# Altium footprint library MyPcbLib.PcbLib: 657 footprints (part 36 of 42)
Each footprint in its own frame and in the unit in brackets; x right, y up, seen from the top. Pads: shape width x height; smd on the part's side, far side on the other; paste and mask are expansions set on the pad; w line width, h text height; cw(c..) or ccw(c..) is an arc to the next point about the centre after c.
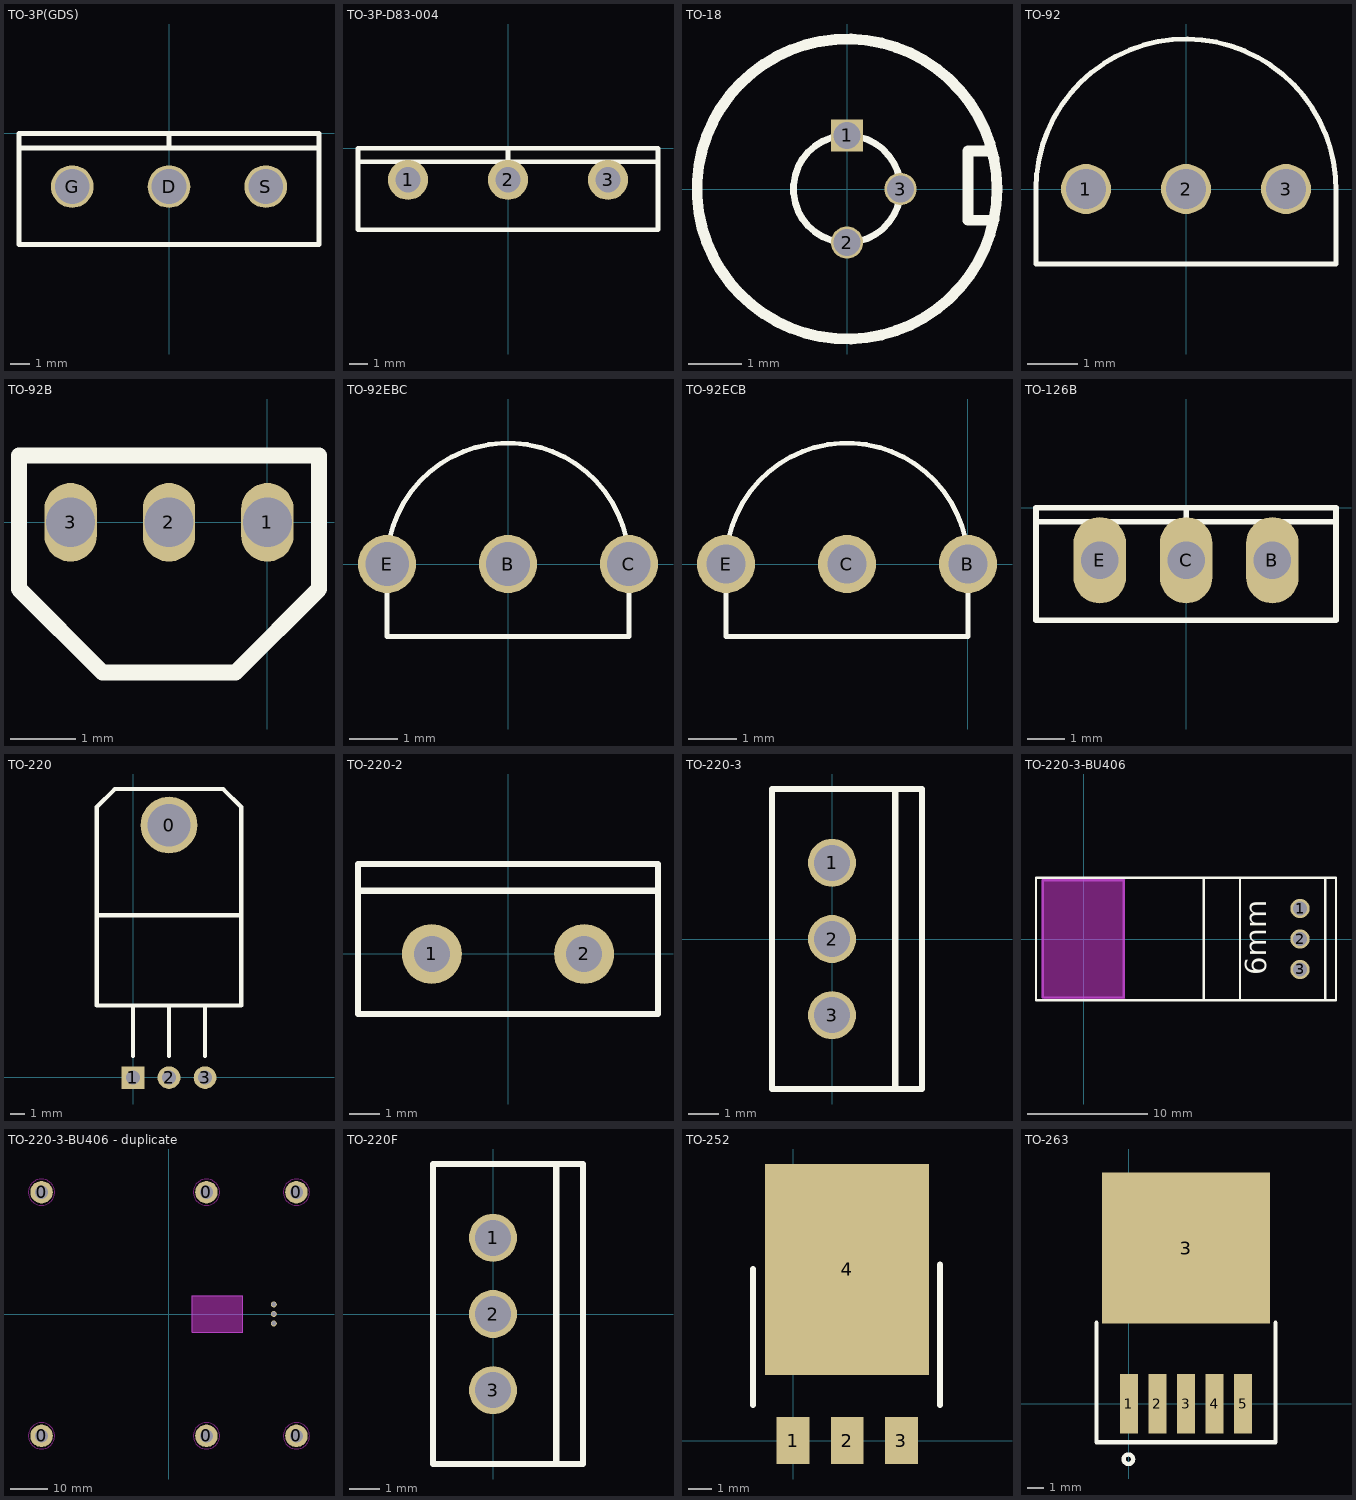
[diagram p35: the footprints below, top view; thin cyan lines are the x and y axes]

## TO-3P(GDS) [mm]
pads (3):
  round 2.2 / inner round 2.2 / far side oval 2.6x4 hole 1.8: D(0,-2.75) G(-5,-2.75) S(5,-2.75)
Top Overlay:
  lines w0.25: -7.75,-0.75 7.75,-0.75 ; 0,-0.75 0,0 ; -7.75,-5.75 7.75,-5.75 7.75,0 -7.75,0 -7.75,-5.75

## TO-3P-D83-004 [mm]
pads (3):
  round 2.2 / inner round 2.2 / far side oval 2.6x4 hole 1.4: 1(-5.5,-1.75) 2(0,-1.75) 3(5.5,-1.75)
Top Overlay:
  lines w0.25: -8.25,-0.75 8.25,-0.75 ; 0,-0.75 0,0 ; -8.25,-4.5 -8.25,0 8.25,0 8.25,-4.5 -8.25,-4.5

## TO-18 [mm]
pads (3):
  rect 0.6x0.6 hole 0.5: 1(0,1)
  round 0.6 hole 0.5: 2(0,-1) 3(1,0)
Top Overlay:
  circle w0.127: c0,0 r1
  circle w0.203: c0,0 r2.8
  lines w0.203: 2.667,-0.584 2.261,-0.584 2.261,0.711 2.667,0.711

## TO-92 [mm]
pads (3):
  round 1 hole 0.8: 1(-2,0) 2(0,0) 3(2,0)
Top Overlay:
  lines w0.1: 3,-0.053 ccw(c0,0) -3,0 -3,-1.5 3,-1.5 3,0

## TO-92B [mm]
pads (3):
  oval 0.8x1.2 hole 0.75: 1(0,0) 2(-1.5,0) 3(-3,0)
Top Overlay:
  lines w0.245: -3.786,-1.016 -2.516,-2.286 -0.484,-2.286 0.786,-1.016 0.786,1.016 -3.786,1.016 -3.786,-1.016
3D body: height 7.58, standoff -2, extent -3.786,-2.416 0.794,1.144

## TO-92EBC [mm]
pads (3):
  round 1.2 / inner round 1.2 / far side oval 1.6x2 hole 0.9: B(0,0) C(2.5,0) E(-2.5,0)
Top Overlay:
  lines w0.1: -2.5,-1.5 2.5,-1.5 2.5,0 ccw(c0,0) -2.5,0 -2.5,-1.5

## TO-92ECB [mm]
pads (3):
  round 1.2 / inner round 1.2 / far side oval 1.4x2 hole 0.8: B(0,0) C(-2.5,0) E(-5,0)
Top Overlay:
  lines w0.1: -5,-1.5 0,-1.5 0,0 ccw(c-2.5,0) -5,0 -5,-1.5

## TO-126B [mm]
pads (3):
  oval 1.4x2.3 hole 1: B(2.3,-1.4) C(0,-1.4) E(-2.3,-1.4)
Top Overlay:
  lines w0.15: -4,-0.382 -4,-0.375 3.995,-0.375 ; 0,-0.375 0,0 ; -4,-3 3.995,-3 3.995,0 -4,0 -4,-3

## TO-220 [mm]
pads (4):
  round 4 hole 3: 0(2.531,17.769)
  rect 1.6x1.6 hole 1: 1(-0.009,-0.011)
  round 1.6 hole 1: 2(2.531,-0.011) 3(5.071,-0.011)
Top Overlay:
  lines w0.305: -2.549,11.419 7.611,11.419 ; -0.009,1.513 -0.009,5.069 ; 2.531,1.513 2.531,5.069 ; 5.071,1.513 5.071,5.069 ; -2.549,5.069 7.611,5.069 7.611,16.499 7.611,19.039 6.341,20.309 -1.279,20.309 -2.549,19.039 -2.549,16.499 -2.549,5.069
3D body: height 4.25, standoff -2, extent -2.469,-0.011 7.531,20.989

## TO-220-2 [mm]
pads (2):
  round 2 hole 1.2: 1(-2.54,0) 2(2.54,0)
Top Overlay:
  lines w0.203: -5,2.108 4.924,2.108 ; -5,-2 -5,3 5,3 5,-2 -5,-2
3D body: height 15.2, standoff -2, extent -4.924,-2.032 5.076,2.368

## TO-220-3 [mm]
pads (3):
  round 1.6 hole 1.2: 1(0,2.54) 2(0,0) 3(0,-2.54)
Top Overlay:
  lines w0.203: 2.108,-4.924 2.108,5 ; -2,-5 -2,5 3,5 3,-5 -2,-5
3D body: height 0, standoff -17.2, extent -2.108,-5.025 2.292,4.975

## TO-220-3-BU406 [mm]
pads (3):
  round 1.6 hole 1.2: 1(18.009,2.54) 2(18.009,0) 3(18.009,-2.54)
Top Overlay:
  lines w0.203: -3.991,-5.1 21.009,-5.1 ; -3.991,-5.029 -3.991,4.978 ; -3.991,5.1 21.009,5.1 ; 10,-4.953 10,4.978 ; 13.009,-4.978 13.009,4.953 ; 20.117,-4.924 20.117,5 ; 21.009,-5 21.009,5
  text "6mm" at 15.773,-3.023 h3
Keep-Out Layer:
  board cut-out: -3.455,-4.877 -3.463,4.851 -3.453,4.876 -3.452,4.876 -3.453,4.876 -3.464,4.902 -3.431,4.98 -3.353,5.013 -3.353,5.004 3.411,5.008 3.433,4.953 3.411,4.898 3.406,4.902 3.411,-4.873 3.433,-4.928 3.411,-4.983 3.406,-4.979 -3.353,-4.987 -3.431,-4.955 -3.463,-4.877
Keep-Out Layer:
  lines w0.203: -3.429,4.851 -3.429,-4.877 3.33,-4.877 3.33,4.902 -3.429,4.902
Mechanical 1:
  lines w0.203: -3.429,4.851 -3.429,-4.877 3.33,-4.877 3.33,4.902 -3.429,4.902
3D body: height 6.7, standoff -2, extent -3.372,-5.044 18.308,5.156

## TO-220-3-BU406 - duplicate [mm]
pads (9):
  round 6 hole 3.5: 0(-34,-32.5) 0(-34,32.5) 0(10,-32.5) 0(10,32.5) 0(34,-32.5) 0(34,32.5)
  round 1.6 hole 1.2: 1(27.965,-2.515) 2(27.965,0.025) 3(27.965,2.565)
Bottom Overlay:
  lines w0.203: -40.005,-38.481 39.929,-38.481 ; -39.98,-38.489 -39.98,38.511 40.02,38.511 40.02,-38.489 ; 5.965,-5.075 30.965,-5.075 ; 5.965,-4.953 5.965,5.055 ; 5.965,5.125 30.965,5.125 ; 19.957,-4.953 19.957,4.978 ; 22.965,-4.928 22.965,5.004 ; 30.074,-4.975 30.074,4.949 ; 30.965,-4.975 30.965,5.025
  text "6mm" at 25.73,3.048 h3
Keep-Out Layer:
  board cut-out: 19.685,-4.826 19.71,-4.851 19.71,4.826 19.736,4.851 6.248,4.851 6.223,4.826 6.223,-4.826
Keep-Out Layer:
  circle w0.254: c-34,32.5 r3.5
  circle w0.254: c10,32.5 r3.5
  circle w0.254: c34,32.5 r3.5
  circle w0.254: c34,-32.5 r3.5
  circle w0.254: c10,-32.5 r3.5
  circle w0.254: c-34,-32.5 r3.5
  lines w0.203: 6.197,-4.877 19.736,-4.877 19.736,4.902 6.198,4.902 6.198,-4.826
Mechanical 1:
  lines w0.203: 6.197,-4.877 19.736,-4.877 19.736,4.902 6.198,4.902 6.198,-4.826

## TO-220F [mm]
pads (3):
  round 1.6 hole 1.2: 1(0,2.54) 2(0,0) 3(0,-2.54)
Top Overlay:
  lines w0.203: 2.108,-4.924 2.108,5 ; -2,-5 3,-5 3,5 -2,5 -2,-5
3D body: height 1, standoff -20.87, extent -1.769,-5.121 2.931,5.02

## TO-252 [mm]
pads (4):
  rect 1.4x2 smd: 1(-0.013,0.003) 2(2.299,0.003) 3(4.61,0.003)
  rect 7x9 smd: 4(2.287,7.303)
Top Overlay:
  lines w0.254: -1.729,1.527 -1.729,7.318 ; 6.248,1.527 6.248,7.518

## TO-263 [mm]
height 1.5
pads (6):
  rect 1.07x3.556 smd: 1(0,0) 2(1.7,0) 3(3.4,0) 4(5.1,0) 5(6.8,0)
  rect 10x9 smd: 3(3.4,9.271)
Top Overlay:
  circle w0.254: c-0.03,-3.302 r0.284
  lines w0.254: -1.934,4.826 -1.934,-2.286 8.734,-2.286 8.734,4.826